# Altium footprint library 7-Connectors-11.PcbLib: 59 footprints (part 2 of 4)
Each footprint in its own frame and in the unit in brackets; x right, y up, seen from the top. Pads: shape width x height; smd on the part's side, far side on the other; paste and mask are expansions set on the pad; w line width, h text height; cw(c..) or ccw(c..) is an arc to the next point about the centre after c.
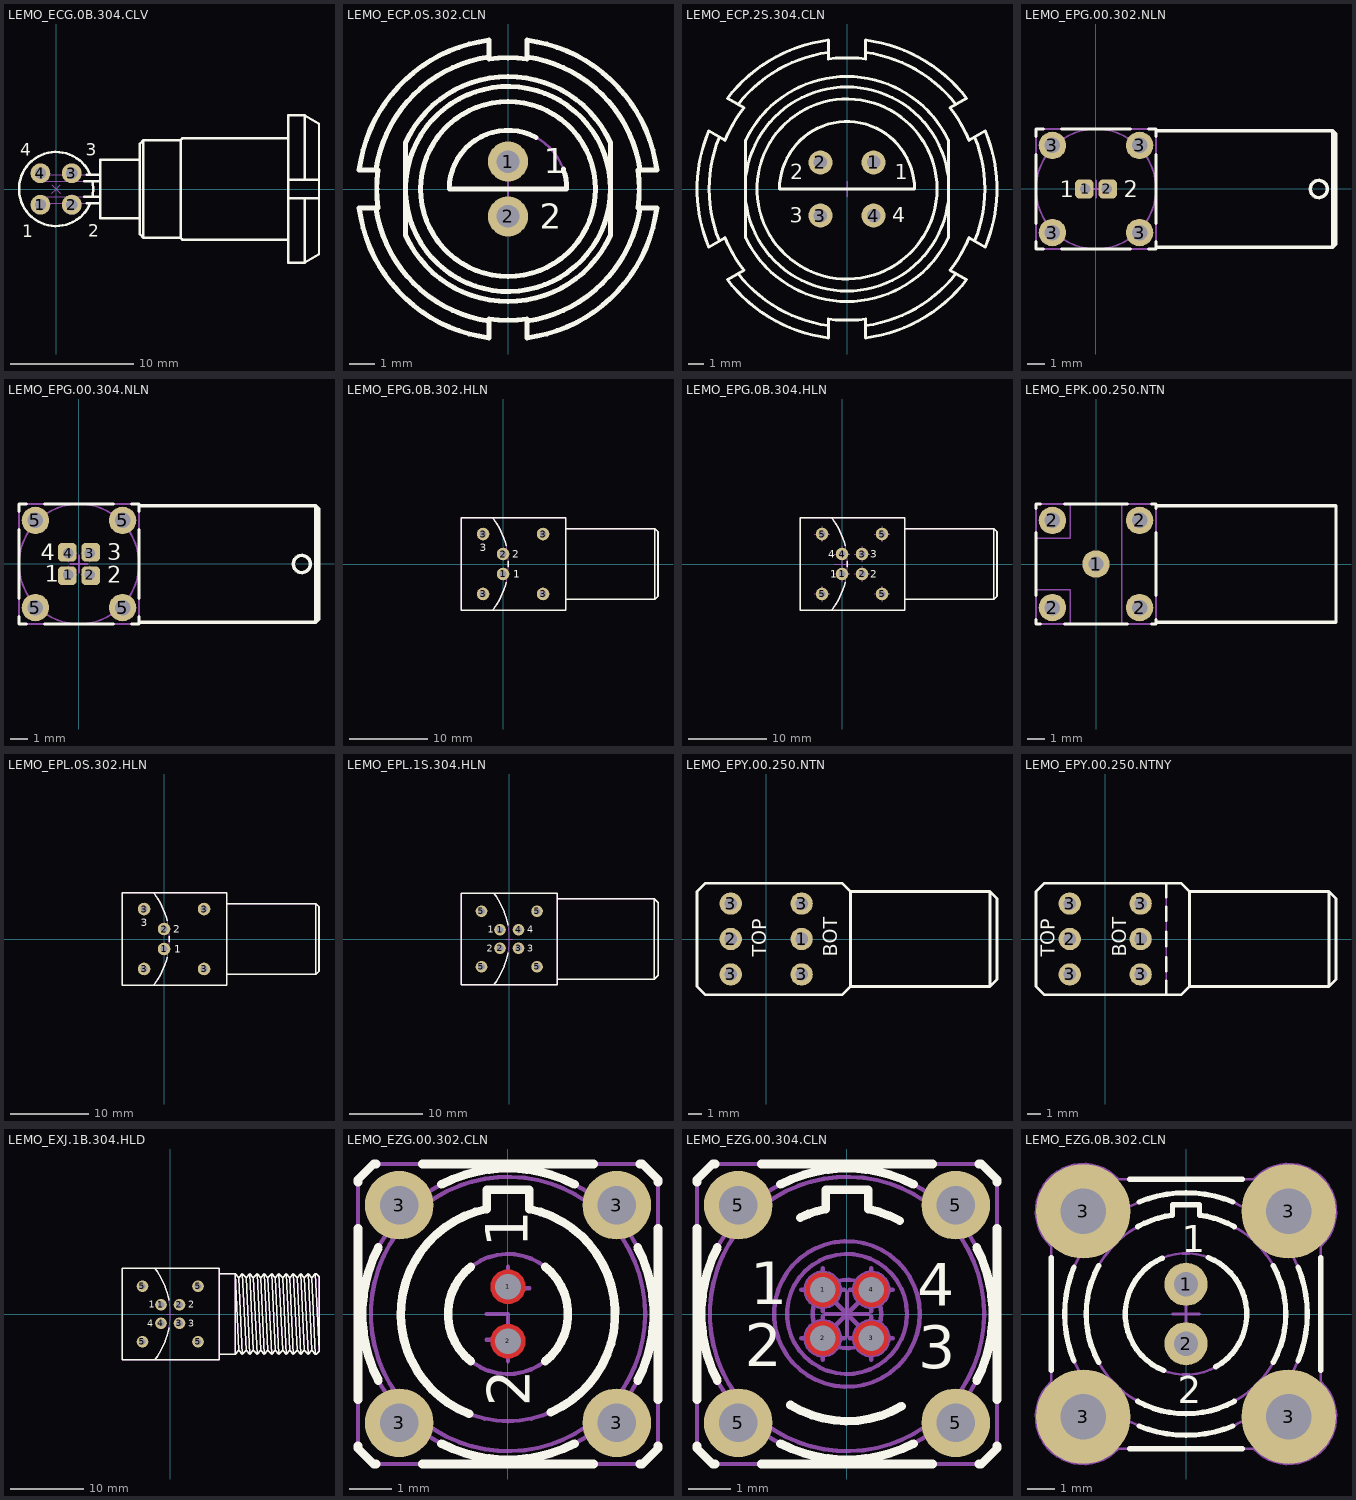
[diagram p1: the footprints below, top view; thin cyan lines are the x and y axes]

## LEMO_ECG.0B.304.CLV [mm] "Size 0B, 4 Female Contacts Elbow Receptacle (90? With Two Nut For Panel Mounting"
height 15.5
pads (4):
  round 1.6 hole 0.9: 1(-1.27,-1.27) 2(1.27,-1.27) 3(1.27,1.27) 4(-1.27,1.27)
Top Overlay:
  lines w0.2: 2.288,-0.634 3.57,-0.634 ; 2.288,0.634 3.57,0.634 ; 2.462,-1.134 3.57,-1.134 ; 2.462,1.134 3.57,1.134 ; 2.777,-1.134 cw(c0,0) 2.777,1.134 ; 2.932,-0.634 ccw(c0,0) 2.932,0.634 ; 6.77,-2.36 3.57,-2.36 3.57,2.36 6.77,2.36 ; 18.77,-4.1 10.22,-4.1 10.07,-3.95 ; 18.77,-0.75 21.27,-0.75 ; 18.77,0.75 21.27,0.75 ; 18.77,4.1 10.22,4.1 10.07,3.95 ; 20.12,-0.75 20.12,-5.953 ; 20.12,0.75 20.12,5.953 ; 21.27,-4.1 21.27,4.1 ; 7.07,-3.95 6.77,-3.65 6.77,3.65 7.07,3.95 ; 7.07,-3.95 10.07,-3.95 ; 7.07,-3.95 7.07,3.95 ; 7.07,3.95 10.07,3.95 ; 10.07,-3.95 10.07,3.95 ; 20.12,-5.953 21.27,-5.283 21.27,5.283 20.12,5.953 ; 20.12,-5.953 18.77,-5.953 18.77,5.953 20.12,5.953
  text "2" at 2.602,-3.868 h1
  text "1" at -2.75,-3.9 h1
  text "3" at 2.402,2.708 h1
  text "4" at -2.898,2.708 h1
Mechanical 8:
  lines w0.1: -1.77,-1.27 -1.27,-1.27 ; -1.77,1.27 -1.27,1.27 ; -1.27,-1.77 -1.27,-1.27 ; -1.27,-0.77 -1.27,-1.27 ; -1.27,0.77 -1.27,1.27 ; -1.27,1.77 -1.27,1.27 ; -0.77,-1.27 -1.27,-1.27 ; -0.77,1.27 -1.27,1.27 ; -0.354,-0.354 0,0 ; -0.354,0.354 0,0 ; 0.354,-0.354 0,0 ; 0.354,0.354 0,0 ; 0.77,-1.27 1.27,-1.27 ; 0.77,1.27 1.27,1.27 ; 1.27,-1.77 1.27,-1.27 ; 1.27,-0.77 1.27,-1.27 ; 1.27,0.77 1.27,1.27 ; 1.27,1.77 1.27,1.27 ; 1.77,-1.27 1.27,-1.27 ; 1.77,1.27 1.27,1.27
Mechanical 14:
  lines w0.1: -1.514,-1.055 ccw(c-1.27,-1.27) -0.969,-1.147 ; -1.514,1.055 cw(c-1.27,1.27) -0.969,1.147 ; 0.532,-1.134 ccw(c1.27,-1.27) 2.008,-1.134 ; 0.873,-0.634 cw(c1.27,-1.27) 1.667,-0.634 ; 0.975,1.134 cw(c1.27,1.27) 1.565,1.134 ; 1.02,-1.134 1.02,-1.27 ccw(c1.27,-1.27) 1.52,-1.27 1.52,-1.134 ; 1.02,1.134 1.02,1.27 cw(c1.27,1.27) 1.52,1.27 1.52,1.134 ; 2.777,-1.134 cw(c0,0) 2.777,1.134 ; 2.932,-0.634 ccw(c0,0) 2.932,0.634 ; 3.57,-1.134 -0.92,-1.134 ccw(c-0.92,-1.234) -1.02,-1.234 -1.02,-1.27 cw(c-1.27,-1.27) -1.52,-1.27 -1.52,-1.134 cw(c-1.02,-1.134) -1.02,-0.634 3.57,-0.634 ; 3.57,0.634 -1.02,0.634 cw(c-1.02,1.134) -1.52,1.134 -1.52,1.27 cw(c-1.27,1.27) -1.02,1.27 -1.02,1.234 ccw(c-0.92,1.234) -0.92,1.134 3.57,1.134 ; 6.77,-2.36 3.57,-2.36 3.57,2.36 6.77,2.36 ; 18.77,-4.1 10.22,-4.1 10.07,-3.95 ; 18.77,-0.75 21.27,-0.75 ; 18.77,0.75 21.27,0.75 ; 18.77,4.1 10.22,4.1 10.07,3.95 ; 20.12,-0.75 20.12,-5.953 ; 20.12,0.75 20.12,5.953 ; 21.27,-4.1 21.27,4.1 ; 7.07,-3.95 6.77,-3.65 6.77,3.65 7.07,3.95 ; 7.07,-3.95 10.07,-3.95 ; 7.07,-3.95 7.07,3.95 ; 7.07,3.95 10.07,3.95 ; 10.07,-3.95 10.07,3.95 ; 20.12,-5.953 21.27,-5.283 21.27,5.283 20.12,5.953 ; 20.12,-5.953 18.77,-5.953 18.77,5.953 20.12,5.953
  text "2" at 2.602,-3.868 h1
  text "1" at -2.75,-3.9 h1
  text "3" at 2.402,2.708 h1
  text "4" at -2.898,2.708 h1
3D body "LEMO_ECG.0B.304.CLV_Part9.stp": height -18.7, standoff -23.7, extent -1.52,-1.52 1.52,1.52
3D body "LEMO_ECG.0B.304.CLV_Part8.stp": height -13.7, standoff -18.7, extent -1.52,-1.52 1.52,1.52
3D body "LEMO_ECG.0B.304.CLV_Part5.stp": height 2.3, standoff 0, extent -3,-3 3,3
3D body "LEMO_ECG.0B.304.CLV_Part4.stp": height 12.45, standoff 0.05, extent 13.265,-5.5 15.265,5.5
3D body "LEMO_ECG.0B.304.CLV_Part3.stp": height 12.5, standoff 0, extent 15.27,-6.25 16.27,6.25
3D body "LEMO_ECG.0B.304.CLV_Part1.stp": height 10.75, standoff -3.7, extent -1.52,-4.1 21.27,4.1
3D body "LEMO_ECG.0B.304.CLV_Part2.stp": height 12.2, standoff 0.3, extent 18.77,-5.953 21.27,5.953
3D body "LEMO_ECG.0B.304.CLV_Part6.stp": height -3.7, standoff -8.7, extent -1.52,-1.52 1.52,1.52
3D body "LEMO_ECG.0B.304.CLV_Part7.stp": height -8.7, standoff -13.7, extent -1.52,-1.52 1.52,1.52
3D body "LEMO_ECG.0B.304.CLV_Part10.stp": height -23.7, standoff -28.7, extent -1.52,-1.52 1.52,1.52
3D body "LEMO_ECG.0B.304.CLV_Part11.stp": height -28.7, standoff -33.7, extent -1.52,-1.52 1.52,1.52
3D body "LEMO_ECG.0B.304.CLV_Part12.stp": height -33.7, standoff -38.7, extent -1.52,-1.52 1.52,1.52

## LEMO_ECP.0S.302.CLN [mm] "Size 0S, Fixed Receptacle with 2 Nuts, Straight Contacts 1 Female + 1 Male  (Hermaphroditic Keying)"
height 15
pads (2):
  round 1.6 hole 0.9: 1(0,1.1) 2(0,-1.1)
Top Overlay:
  circle w0.2: c0,0 r3.5
  circle w0.2: c0,0 r4.1
  lines w0.2: -5.283,-0.75 ccw(c0,0) -0.75,-5.283 ; -5.283,0.75 cw(c0,0) -0.75,5.283 ; 0.75,-5.283 ccw(c0,0) 5.283,-0.75 ; 0.75,5.283 cw(c0,0) 5.283,0.75 ; 1.114,2.069 ccw(c0,0) -2.35,0 2.35,0 ccw(c0,0) 2.213,0.79 ; -5.953,-0.75 ccw(c0,0) -0.75,-5.953 -0.75,-5.196 ccw(c0,0) 0.75,-5.196 0.75,-5.953 ccw(c0,0) 5.953,-0.75 5.196,-0.75 ccw(c0,0) 5.196,0.75 5.953,0.75 ccw(c0,0) 0.75,5.953 0.75,5.196 ccw(c0,0) -0.75,5.196 -0.75,5.953 ccw(c0,0) -5.953,0.75 -5.196,0.75 ccw(c0,0) -5.196,-0.75 -5.953,-0.75 ; -4.1,-1.855 ccw(c0,0) 4.1,-1.855 4.1,1.855 ccw(c0,0) -4.1,1.855 -4.1,-1.855
  text "1" at 1.429,0.635 h1
  text "2" at 1.27,-1.587 h1
Mechanical 8:
  lines w0.1: -0.5,-1.1 0,-1.1 ; -0.5,0 0,0 ; -0.5,1.1 0,1.1 ; 0,-1.6 0,-1.1 ; 0,-0.6 0,-1.1 ; 0,-0.5 0,0 ; 0,0.5 0,0 ; 0,0.6 0,1.1 ; 0,1.6 0,1.1 ; 0.5,-1.1 0,-1.1 ; 0.5,0 0,0 ; 0.5,1.1 0,1.1
Mechanical 14:
  circle w0.1: c0,-1.1 r0.35
  circle w0.4: c0,-1.1 r0.2
  circle w0.1: c0,1.1 r0.35
  circle w0.1: c0,0 r3.5
  circle w0.1: c0,0 r4.1
  lines w0.1: -5.283,-0.75 ccw(c0,0) -0.75,-5.283 ; -5.283,0.75 cw(c0,0) -0.75,5.283 ; 0.75,-5.283 ccw(c0,0) 5.283,-0.75 ; 0.75,5.283 cw(c0,0) 5.283,0.75 ; -5.953,-0.75 ccw(c0,0) -0.75,-5.953 -0.75,-5.196 ccw(c0,0) 0.75,-5.196 0.75,-5.953 ccw(c0,0) 5.953,-0.75 5.196,-0.75 ccw(c0,0) 5.196,0.75 5.953,0.75 ccw(c0,0) 0.75,5.953 0.75,5.196 ccw(c0,0) -0.75,5.196 -0.75,5.953 ccw(c0,0) -5.953,0.75 -5.196,0.75 ccw(c0,0) -5.196,-0.75 -5.953,-0.75 ; -4.1,-1.855 ccw(c0,0) 4.1,-1.855 4.1,1.855 ccw(c0,0) -4.1,1.855 -4.1,-1.855 ; -2.35,0 cw(c0,0) 2.35,0 -2.35,0
  text "1" at 1.429,0.635 h1
  text "2" at 1.27,-1.587 h1
3D body "LEMO_ECP.0S.302.CLN.stp": height 15, standoff -3.2, extent -6.25,-6.25 6.25,6.25

## LEMO_ECP.2S.304.CLN [mm] "Size 2S, Fixed Receptacle with 2 Nuts, Straight Contacts 2 Females + 2 Males  (Hermaphroditic Keying)"
height 20
pads (4):
  round 1.6 hole 0.9: 1(1.768,1.768) 2(-1.768,1.768) 3(-1.768,-1.768) 4(1.768,-1.768)
Top Overlay:
  circle w0.2: c0,0 r6
  lines w0.2: -8.511,-3.471 cw(c0,0) -8.511,3.471 ; -7.261,-5.636 ccw(c0,0) -1.25,-9.106 ; -7.261,5.636 cw(c0,0) -1.25,9.106 ; -6.75,-0.823 ccw(c0,0) 6.75,-0.823 ; -6.75,0.823 cw(c0,0) 6.75,0.823 ; 1.25,-9.106 ccw(c0,0) 7.261,-5.636 ; 1.25,9.106 cw(c0,0) 7.261,5.636 ; 8.511,-3.471 ccw(c0,0) 8.511,3.471 ; -9.217,-3.878 cw(c0,0) -9.217,3.878 -8.125,3.248 cw(c0,0) -6.875,5.413 -7.967,6.043 cw(c0,0) -1.25,9.922 -1.25,8.66 cw(c0,0) 1.25,8.66 1.25,9.922 cw(c0,0) 7.967,6.043 6.875,5.413 cw(c0,0) 8.125,3.248 9.217,3.878 cw(c0,0) 9.217,-3.878 8.125,-3.248 cw(c0,0) 6.875,-5.413 7.967,-6.043 cw(c0,0) 1.25,-9.922 1.25,-8.66 cw(c0,0) -1.25,-8.66 -1.25,-9.922 cw(c0,0) -7.967,-6.043 -6.875,-5.413 cw(c0,0) -8.125,-3.248 -9.217,-3.878 ; -6.75,-3.269 ccw(c0,0) 6.75,-3.269 6.75,3.269 ccw(c0,0) -6.75,3.269 -6.75,-3.269 ; -4.5,0 cw(c0,0) 4.5,0 -4.5,0
  text "2" at -3.788,0.635 h1
  text "3" at -3.81,-2.244 h1
  text "4" at 3.016,-2.222 h1
  text "1" at 3.197,0.635 h1
Mechanical 8:
  lines w0.1: -2.268,-1.768 -1.768,-1.768 ; -2.268,1.768 -1.768,1.768 ; -1.768,-2.268 -1.768,-1.768 ; -1.768,-1.268 -1.768,-1.768 ; -1.768,1.268 -1.768,1.768 ; -1.768,2.268 -1.768,1.768 ; -1.268,-1.768 -1.768,-1.768 ; -1.268,1.768 -1.768,1.768 ; -0.5,0 0,0 ; 0,-0.5 0,0 ; 0,0.5 0,0 ; 0.5,0 0,0 ; 1.268,-1.768 1.768,-1.768 ; 1.268,1.768 1.768,1.768 ; 1.768,-2.268 1.768,-1.768 ; 1.768,-1.268 1.768,-1.768 ; 1.768,1.268 1.768,1.768 ; 1.768,2.268 1.768,1.768 ; 2.268,-1.768 1.768,-1.768 ; 2.268,1.768 1.768,1.768
Mechanical 14:
  circle w0.7: c1.768,-1.768 r0.35
  circle w0.7: c-1.768,-1.768 r0.35
  circle w0.1: c-1.768,-1.768 r0.7
  circle w0.1: c1.768,-1.768 r0.7
  circle w0.1: c-1.768,1.768 r0.7
  circle w0.1: c1.768,1.768 r0.7
  circle w0.1: c0,0 r6
  lines w0.1: -8.511,-3.471 cw(c0,0) -8.511,3.471 ; -7.261,-5.636 ccw(c0,0) -1.25,-9.106 ; -7.261,5.636 cw(c0,0) -1.25,9.106 ; -6.75,-0.823 ccw(c0,0) 6.75,-0.823 ; -6.75,0.823 cw(c0,0) 6.75,0.823 ; 1.25,-9.106 ccw(c0,0) 7.261,-5.636 ; 1.25,9.106 cw(c0,0) 7.261,5.636 ; 8.511,-3.471 ccw(c0,0) 8.511,3.471 ; -9.217,-3.878 cw(c0,0) -9.217,3.878 -8.125,3.248 cw(c0,0) -6.875,5.413 -7.967,6.043 cw(c0,0) -1.25,9.922 -1.25,8.66 cw(c0,0) 1.25,8.66 1.25,9.922 cw(c0,0) 7.967,6.043 6.875,5.413 cw(c0,0) 8.125,3.248 9.217,3.878 cw(c0,0) 9.217,-3.878 8.125,-3.248 cw(c0,0) 6.875,-5.413 7.967,-6.043 cw(c0,0) 1.25,-9.922 1.25,-8.66 cw(c0,0) -1.25,-8.66 -1.25,-9.922 cw(c0,0) -7.967,-6.043 -6.875,-5.413 cw(c0,0) -8.125,-3.248 -9.217,-3.878 ; -6.75,-3.269 ccw(c0,0) 6.75,-3.269 6.75,3.269 ccw(c0,0) -6.75,3.269 -6.75,-3.269 ; -4.5,0 cw(c0,0) 4.5,0 -4.5,0
  text "2" at -3.788,0.635 h1
  text "3" at -3.81,-2.244 h1
  text "4" at 3.016,-2.222 h1
  text "1" at 3.197,0.635 h1
3D body "LEMO_ECP.2S.304.CLN.stp": height 20, standoff -3, extent -10,-9.921 10,9.922

## LEMO_EPG.00.302.NLN [mm] "Multipole 2 Contacts, 50 Ohm size 00 Coaxial Elbow (90? Socket With Key"
height 7
pads (6):
  rrect50% 1.1x1.1 hole 0.6 copper offset -0.05,0: 1(-0.635,0)
  rrect50% 1.1x1.1 hole 0.6 copper offset 0.05,0: 2(0.635,0)
  round 1.6 hole 0.9: 3(-2.54,-2.54) 3(-2.54,2.54) 3(2.54,-2.54) 3(2.54,2.54)
Top Overlay:
  circle w0.2: c13,0 r0.5
  lines w0.2: -3.5,-3.077 -3.5,-3.5 -3.077,-3.5 ; -3.5,-2.003 -3.5,2.003 ; -3.5,3.077 -3.5,3.5 -3.077,3.5 ; -2.003,-3.5 2.003,-3.5 ; -2.003,3.5 2.003,3.5 ; 3.077,-3.5 3.5,-3.5 3.5,-3.077 ; 3.077,3.5 3.5,3.5 3.5,3.077 ; 3.5,-3.4 13.8,-3.4 ; 3.5,-2.003 3.5,2.003 ; 3.5,3.399 13.8,3.4 ; 13.8,-3.4 14,-3.2 14,3.2 13.8,3.4 ; 13.8,-3.4 13.8,3.4
  text "2" at 1.613,-0.473 h0.97
  text "1" at -2.119,-0.48 h0.97
Mechanical 8:
  lines w0.1: -3.04,-2.54 -2.54,-2.54 ; -3.04,2.54 -2.54,2.54 ; -2.54,-3.04 -2.54,-2.54 ; -2.54,-2.04 -2.54,-2.54 ; -2.54,2.04 -2.54,2.54 ; -2.54,3.04 -2.54,2.54 ; -2.04,-2.54 -2.54,-2.54 ; -2.04,2.54 -2.54,2.54 ; -1.1,0 -0.6,0 ; -0.6,-0.5 -0.6,0 ; -0.6,0.5 -0.6,0 ; -0.5,0 0,0 ; -0.1,0 -0.6,0 ; 0,-0.5 0,0 ; 0,0.5 0,0 ; 0.1,0 0.6,0 ; 0.5,0 0,0 ; 0.6,-0.5 0.6,0 ; 0.6,0.5 0.6,0 ; 1.1,0 0.6,0 ; 2.04,-2.54 2.54,-2.54 ; 2.04,2.54 2.54,2.54 ; 2.54,-3.04 2.54,-2.54 ; 2.54,-2.04 2.54,-2.54 ; 2.54,2.04 2.54,2.54 ; 2.54,3.04 2.54,2.54 ; 3.04,-2.54 2.54,-2.54 ; 3.04,2.54 2.54,2.54
Mechanical 14:
  circle w0.1: c0,0 r3.5
  circle w0.1: c13,0 r0.5
  lines w0.1: 3.5,-3.4 13.8,-3.4 ; 3.5,3.399 13.8,3.4 ; 13.8,-3.4 14,-3.2 14,3.2 13.8,3.4 ; 13.8,-3.4 13.8,3.4 ; -3.5,-3.5 3.5,-3.5 3.5,3.5 -3.5,3.5 -3.5,-3.5
  text "2" at 1.613,-0.473 h0.97
  text "1" at -2.119,-0.48 h0.97
3D body "LEMO_EPG.00.302.NLN.stp": height 7, standoff -3, extent -3.5,-3.5 14,3.5

## LEMO_EPG.00.304.NLN [mm] "Multipole 4 Contacts, 50 Ohm size 00 Coaxial Elbow (90? Socket With Key"
height 7
pads (8):
  rrect50% 1.1x1.1 hole 0.6 copper offset -0.05,-0.05: 1(-0.635,-0.635)
  rrect50% 1.1x1.1 hole 0.6 copper offset 0.05,-0.05: 2(0.635,-0.635)
  rrect50% 1.1x1.1 hole 0.6 copper offset 0.05,0.05: 3(0.635,0.635)
  rrect50% 1.1x1.1 hole 0.6 copper offset -0.05,0.05: 4(-0.635,0.635)
  round 1.6 hole 0.9: 5(-2.54,-2.54) 5(-2.54,2.54) 5(2.54,-2.54) 5(2.54,2.54)
Top Overlay:
  circle w0.2: c13,0 r0.5
  lines w0.2: -3.5,-3.077 -3.5,-3.5 -3.077,-3.5 ; -3.5,-2.003 -3.5,2.003 ; -3.5,3.077 -3.5,3.5 -3.077,3.5 ; -2.003,-3.5 2.003,-3.5 ; -2.003,3.5 2.003,3.5 ; 3.077,-3.5 3.5,-3.5 3.5,-3.077 ; 3.077,3.5 3.5,3.5 3.5,3.077 ; 3.5,-3.4 13.8,-3.4 ; 3.5,-2.003 3.5,2.003 ; 3.5,3.399 13.8,3.4 ; 13.8,-3.4 13.8,3.4 ; 13.8,-3.4 14,-3.2 14,3.2 13.8,3.4
  text "1" at -2.007,-1.048 h0.97
  text "4" at -2.231,0.232 h0.97
  text "3" at 1.652,0.208 h0.97
  text "2" at 1.648,-1.108 h0.97
Mechanical 8:
  lines w0.1: -3.04,-2.54 -2.54,-2.54 ; -3.04,2.54 -2.54,2.54 ; -2.54,-3.04 -2.54,-2.54 ; -2.54,-2.04 -2.54,-2.54 ; -2.54,2.04 -2.54,2.54 ; -2.54,3.04 -2.54,2.54 ; -2.04,-2.54 -2.54,-2.54 ; -2.04,2.54 -2.54,2.54 ; -1.135,-0.635 -0.635,-0.635 ; -1.135,0.635 -0.635,0.635 ; -0.635,-1.135 -0.635,-0.635 ; -0.635,-0.135 -0.635,-0.635 ; -0.635,0.135 -0.635,0.635 ; -0.635,1.135 -0.635,0.635 ; -0.5,0 0,0 ; -0.135,-0.635 -0.635,-0.635 ; -0.135,0.635 -0.635,0.635 ; 0,-0.5 0,0 ; 0,0.5 0,0 ; 0.135,-0.635 0.635,-0.635 ; 0.135,0.635 0.635,0.635 ; 0.5,0 0,0 ; 0.635,-1.135 0.635,-0.635 ; 0.635,-0.135 0.635,-0.635 ; 0.635,0.135 0.635,0.635 ; 0.635,1.135 0.635,0.635 ; 1.135,-0.635 0.635,-0.635 ; 1.135,0.635 0.635,0.635 ; 2.04,-2.54 2.54,-2.54 ; 2.04,2.54 2.54,2.54 ; 2.54,-3.04 2.54,-2.54 ; 2.54,-2.04 2.54,-2.54 ; 2.54,2.04 2.54,2.54 ; 2.54,3.04 2.54,2.54 ; 3.04,-2.54 2.54,-2.54 ; 3.04,2.54 2.54,2.54
Mechanical 14:
  circle w0.1: c13,0 r0.5
  circle w0.1: c0,0 r3.5
  lines w0.1: 3.5,-3.4 13.8,-3.4 ; 3.5,3.399 13.8,3.4 ; 13.8,-3.4 13.8,3.4 ; 13.8,-3.4 14,-3.2 14,3.2 13.8,3.4 ; -3.5,-3.5 -3.5,3.5 3.5,3.5 3.5,-3.5 -3.5,-3.5
  text "1" at -2.007,-1.048 h0.97
  text "4" at -2.231,0.232 h0.97
  text "3" at 1.652,0.208 h0.97
  text "2" at 1.648,-1.108 h0.97
3D body "LEMO_EPG.00.304.NLN.stp": height 7, standoff -3, extent -3.5,-3.5 14,3.5

## LEMO_EPG.0B.302.HLN [mm] "Elbow Receptacle (90? With 2 Female Contacts and Key (G) For PCB"
height 12.7
pads (6):
  round 1.6 hole 0.9: 1(0,-1.27) 2(0,1.27) 3(-2.54,-3.81) 3(-2.54,3.81) 3(5.08,-3.81) 3(5.08,3.81)
Top Overlay:
  lines w0.2: -1.32,-5.85 ccw(c-8.876,0) 0.386,-2.353 ; -1.32,5.85 cw(c-8.876,0) 0.386,2.353 ; 0.674,-0.338 ccw(c-8.876,0) 0.674,0.338 ; 7.98,-4.5 19.28,-4.5 ; 7.98,4.5 19.28,4.5 ; 19.28,-4.5 19.68,-4.1 19.68,4.1 19.28,4.5 ; 19.28,-4.5 19.28,4.5 ; -5.32,-5.85 -5.32,5.85 7.98,5.85 7.98,-5.85 -5.32,-5.85
  text "1" at 1.275,-1.75 h0.97
  text "2" at 1.186,0.787 h0.97
  text "3" at -2.975,1.625 h0.97
Mechanical 14:
  circle w0.1: c0,1.27 r0.4
  circle w0.1: c0,-1.27 r0.4
  circle w0.1: c-2.54,-3.81 r0.4
  circle w0.1: c5.08,-3.81 r0.4
  circle w0.1: c5.08,3.81 r0.4
  circle w0.1: c-2.54,3.81 r0.4
  lines w0.1: -1.32,-5.85 ccw(c-8.876,0) -1.32,5.85 ; 7.98,-4.5 19.28,-4.5 ; 7.98,4.5 19.28,4.5 ; 19.28,-4.5 19.68,-4.1 19.68,4.1 19.28,4.5 ; 19.28,-4.5 19.28,4.5 ; -5.32,-5.85 -5.32,5.85 7.98,5.85 7.98,-5.85 -5.32,-5.85
  text "1" at 1.275,-1.75 h0.97
  text "2" at 1.186,0.787 h0.97
  text "3" at -2.975,1.625 h0.97
3D body "LEMO_EPG.0B.302.HLN.stp": height 12.7, standoff -4, extent -5.32,-5.85 19.68,5.85

## LEMO_EPG.0B.304.HLN [mm] "Elbow Receptacle (90? With 4 Female Contacts and Key (G) For PCB"
height 12.7
pads (8):
  round 1.6 hole 0.9: 1(0,-1.27) 2(2.54,-1.27) 3(2.54,1.27) 4(0,1.27) 5(-2.54,-3.81) 5(-2.54,3.81) 5(5.08,-3.81) 5(5.08,3.81)
Top Overlay:
  lines w0.2: -1.32,-5.85 ccw(c-8.876,0) 0.386,-2.353 ; -1.32,5.85 cw(c-8.876,0) 0.386,2.353 ; 0.674,-0.338 ccw(c-8.876,0) 0.674,0.338 ; 7.98,-4.5 19.28,-4.5 ; 7.98,4.5 19.28,4.5 ; 19.28,-4.5 19.68,-4.1 19.68,4.1 19.28,4.5 ; 19.28,-4.5 19.28,4.5 ; -5.32,-5.85 -5.32,5.85 7.98,5.85 7.98,-5.85 -5.32,-5.85
  text "4" at -1.773,0.79 h0.97
  text "3" at 3.599,0.787 h0.97
  text "1" at -1.519,-1.75 h0.97
  text "2" at 3.599,-1.753 h0.97
Mechanical 8:
  lines w0.1: -3.54,-3.81 -2.54,-3.81 ; -3.54,3.81 -2.54,3.81 ; -2.54,-4.81 -2.54,-3.81 ; -2.54,-2.81 -2.54,-3.81 ; -2.54,2.81 -2.54,3.81 ; -2.54,4.81 -2.54,3.81 ; -1.54,-3.81 -2.54,-3.81 ; -1.54,3.81 -2.54,3.81 ; -1,-1.27 0,-1.27 ; -1,0 0,0 ; -1,1.27 0,1.27 ; 0,-2.27 0,-1.27 ; 0,-1 0,0 ; 0,-0.27 0,-1.27 ; 0,0.27 0,1.27 ; 0,1 0,0 ; 0,2.27 0,1.27 ; 1,-1.27 0,-1.27 ; 1,0 0,0 ; 1,1.27 0,1.27 ; 1.54,-1.27 2.54,-1.27 ; 1.54,1.27 2.54,1.27 ; 2.54,-2.27 2.54,-1.27 ; 2.54,-0.27 2.54,-1.27 ; 2.54,0.27 2.54,1.27 ; 2.54,2.27 2.54,1.27 ; 3.54,-1.27 2.54,-1.27 ; 3.54,1.27 2.54,1.27 ; 4.08,-3.81 5.08,-3.81 ; 4.08,3.81 5.08,3.81 ; 5.08,-4.81 5.08,-3.81 ; 5.08,-2.81 5.08,-3.81 ; 5.08,2.81 5.08,3.81 ; 5.08,4.81 5.08,3.81 ; 6.08,-3.81 5.08,-3.81 ; 6.08,3.81 5.08,3.81
Mechanical 14:
  circle w0.1: c2.54,-1.27 r0.4
  circle w0.1: c2.54,1.27 r0.4
  circle w0.1: c0,1.27 r0.4
  circle w0.1: c0,-1.27 r0.4
  circle w0.1: c-2.54,-3.81 r0.4
  circle w0.1: c5.08,-3.81 r0.4
  circle w0.1: c5.08,3.81 r0.4
  circle w0.1: c-2.54,3.81 r0.4
  lines w0.1: -1.32,-5.85 ccw(c-8.876,0) -1.32,5.85 ; 7.98,-4.5 19.28,-4.5 ; 7.98,4.5 19.28,4.5 ; 19.28,-4.5 19.68,-4.1 19.68,4.1 19.28,4.5 ; 19.28,-4.5 19.28,4.5 ; -5.32,-5.85 -5.32,5.85 7.98,5.85 7.98,-5.85 -5.32,-5.85
  text "4" at -1.773,0.79 h0.97
  text "3" at 3.599,0.787 h0.97
  text "1" at -1.519,-1.75 h0.97
  text "2" at 3.599,-1.753 h0.97
3D body "LEMO_EPG.0B.304.HLN.stp": height 12.7, standoff -4, extent -5.32,-5.85 19.68,5.85

## LEMO_EPK.00.250.NTN [mm] "50 Ohm size 00 Coaxial Elbow (90? socket"
height 7
pads (5):
  round 1.6 hole 0.9: 1(0,0) 2(-2.54,-2.54) 2(-2.54,2.54) 2(2.54,-2.54) 2(2.54,2.54)
Top Overlay:
  lines w0.2: -3.5,-3.26 -3.5,-3.5 -3.26,-3.5 ; -3.5,-1.82 -3.5,1.82 ; -3.5,3.26 -3.5,3.5 -3.26,3.5 ; -1.82,-3.5 1.82,-3.5 ; -1.82,3.5 1.82,3.5 ; 3.26,-3.5 3.5,-3.5 3.5,-3.26 ; 3.26,3.5 3.5,3.5 3.5,3.26 ; 3.5,-3.4 14,-3.4 14,3.4 3.5,3.4 ; 3.5,-1.82 3.5,1.82
Mechanical 8:
  lines w0.1: -3.04,-2.54 -2.54,-2.54 ; -3.04,2.54 -2.54,2.54 ; -2.54,-3.04 -2.54,-2.54 ; -2.54,-2.04 -2.54,-2.54 ; -2.54,2.04 -2.54,2.54 ; -2.54,3.04 -2.54,2.54 ; -2.04,-2.54 -2.54,-2.54 ; -2.04,2.54 -2.54,2.54 ; -0.5,0 0,0 ; 0,-0.5 0,0 ; 0,0.5 0,0 ; 0.5,0 0,0 ; 2.04,-2.54 2.54,-2.54 ; 2.04,2.54 2.54,2.54 ; 2.54,-3.04 2.54,-2.54 ; 2.54,-2.04 2.54,-2.54 ; 2.54,2.04 2.54,2.54 ; 2.54,3.04 2.54,2.54 ; 3.04,-2.54 2.54,-2.54 ; 3.04,2.54 2.54,2.54 ; -3.5,-3.5 -1.5,-3.5 -1.5,-1.5 -3.5,-1.5 -3.5,-3.5 ; -3.5,1.5 -1.5,1.5 -1.5,3.5 -3.5,3.5 -3.5,1.5 ; 1.5,-3.5 1.5,3.5 3.5,3.5 3.5,-3.5 1.5,-3.5
Mechanical 14:
  lines w0.1: 1.5,-3.5 3.5,-3.5 ; 3.5,-3.4 14,-3.4 14,3.4 3.5,3.4 ; 3.5,-3.5 3.5,3.5 ; 3.5,-3.5 -3.5,-3.5 -3.5,3.5 3.5,3.5 ; 3.5,-3.5 3.5,3.5
3D body "LEMO_EPK.00.250.NTN.stp": height 7, standoff -3, extent -3.5,-3.5 14,3.5

## LEMO_EPL.0S.302.HLN [mm] "Elbow Receptacle (90? With 1 Female + 1 Male Contacts and Hermaphroditic Keying"
height 12.7
pads (6):
  round 1.6 hole 0.9: 1(0,-1.27) 2(0,1.27) 3(-2.54,-3.81) 3(-2.54,3.81) 3(5.08,-3.81) 3(5.08,3.81)
Top Overlay:
  lines w0.2: -1.32,-5.85 ccw(c-8.876,0) 0.386,-2.353 ; -1.32,5.85 cw(c-8.876,0) 0.386,2.353 ; 0.674,-0.338 ccw(c-8.876,0) 0.674,0.338 ; 7.98,-4.5 19.28,-4.5 ; 7.98,4.5 19.28,4.5 ; 19.28,-4.5 19.28,4.5 ; 19.28,-4.5 19.68,-4.1 19.68,4.1 19.28,4.5 ; -5.32,-5.85 7.98,-5.85 7.98,5.85 -5.32,5.85 -5.32,-5.85
  text "3" at -2.975,1.625 h0.97
  text "2" at 1.186,0.787 h0.97
  text "1" at 1.275,-1.75 h0.97
Mechanical 14:
  circle w0.1: c-2.54,3.81 r0.4
  circle w0.1: c5.08,3.81 r0.4
  circle w0.1: c5.08,-3.81 r0.4
  circle w0.1: c-2.54,-3.81 r0.4
  circle w0.1: c0,-1.27 r0.4
  circle w0.1: c0,1.27 r0.4
  lines w0.1: -1.32,-5.85 ccw(c-8.876,0) -1.32,5.85 ; 7.98,-4.5 19.28,-4.5 ; 7.98,4.5 19.28,4.5 ; 19.28,-4.5 19.28,4.5 ; 19.28,-4.5 19.68,-4.1 19.68,4.1 19.28,4.5 ; -5.32,-5.85 7.98,-5.85 7.98,5.85 -5.32,5.85 -5.32,-5.85
  text "3" at -2.975,1.625 h0.97
  text "2" at 1.186,0.787 h0.97
  text "1" at 1.275,-1.75 h0.97
3D body "LEMO_EPL.0S.302.HLN.stp": height 12.7, standoff -4, extent -5.32,-5.85 19.68,5.85

## LEMO_EPL.1S.304.HLN [mm] "Elbow Socket (90? With 2 Female + 2 Male Contacts For PCB, Serie 1S"
height 14
pads (8):
  round 1.6 hole 0.9: 1(-1.27,1.27) 2(-1.27,-1.27) 3(1.27,-1.27) 4(1.27,1.27) 5(-3.81,-3.81) 5(-3.81,3.81) 5(3.81,-3.81) 5(3.81,3.81)
Top Overlay:
  lines w0.2: -2.132,-6.3 ccw(c-10.375,0) -0.169,-1.861 ; -2.132,6.3 cw(c-10.375,0) -0.169,1.861 ; 6.6,-5.5 19.9,-5.5 ; 6.6,5.5 19.9,5.5 ; 19.9,-5.5 19.9,5.5 ; 19.9,-5.5 20.4,-5 20.4,5 19.9,5.5 ; -6.6,-6.3 6.6,-6.3 6.6,6.3 -6.6,6.3 -6.6,-6.3
  text "1" at -2.932,0.827 h0.97
  text "4" at 2.48,0.827 h0.97
  text "2" at -3.12,-1.748 h0.97
  text "3" at 2.477,-1.717 h0.97
Mechanical 8:
  lines w0.1: -4.31,-3.81 -3.81,-3.81 ; -4.31,3.81 -3.81,3.81 ; -3.81,-4.31 -3.81,-3.81 ; -3.81,-3.31 -3.81,-3.81 ; -3.81,3.31 -3.81,3.81 ; -3.81,4.31 -3.81,3.81 ; -3.31,-3.81 -3.81,-3.81 ; -3.31,3.81 -3.81,3.81 ; -1.77,-1.27 -1.27,-1.27 ; -1.77,1.27 -1.27,1.27 ; -1.27,-1.77 -1.27,-1.27 ; -1.27,-0.77 -1.27,-1.27 ; -1.27,0.77 -1.27,1.27 ; -1.27,1.77 -1.27,1.27 ; -0.77,-1.27 -1.27,-1.27 ; -0.77,1.27 -1.27,1.27 ; -0.5,0 0,0 ; 0,-0.5 0,0 ; 0,0.5 0,0 ; 0.5,0 0,0 ; 0.77,-1.27 1.27,-1.27 ; 0.77,1.27 1.27,1.27 ; 1.27,-1.77 1.27,-1.27 ; 1.27,-0.77 1.27,-1.27 ; 1.27,0.77 1.27,1.27 ; 1.27,1.77 1.27,1.27 ; 1.77,-1.27 1.27,-1.27 ; 1.77,1.27 1.27,1.27 ; 3.31,-3.81 3.81,-3.81 ; 3.31,3.81 3.81,3.81 ; 3.81,-4.31 3.81,-3.81 ; 3.81,-3.31 3.81,-3.81 ; 3.81,3.31 3.81,3.81 ; 3.81,4.31 3.81,3.81 ; 4.31,-3.81 3.81,-3.81 ; 4.31,3.81 3.81,3.81
Mechanical 14:
  lines w0.1: -2.132,-6.3 ccw(c-10.375,0) -2.132,6.3 ; 6.6,-5.5 19.9,-5.5 ; 6.6,5.5 19.9,5.5 ; 19.9,-5.5 19.9,5.5 ; 19.9,-5.5 20.4,-5 20.4,5 19.9,5.5 ; -6.6,-6.3 6.6,-6.3 6.6,6.3 -6.6,6.3 -6.6,-6.3
  text "1" at -2.932,0.827 h0.97
  text "4" at 2.48,0.827 h0.97
  text "2" at -3.12,-1.748 h0.97
  text "3" at 2.477,-1.717 h0.97
3D body "LEMO_EPL.1S.304.HLN.stp": height 14, standoff -4, extent -6.6,-6.3 20.4,6.3

## LEMO_EPY.00.250.NTN [mm] "Dual 50 ohms Size 00 Coaxial Elbow Sockets (90?"
height 14.8
pads (6):
  round 1.6 hole 0.9: 1(2.54,0) 2(-2.54,0) 3(-2.54,-2.54) 3(-2.54,2.54) 3(2.54,-2.54) 3(2.54,2.54)
Top Overlay:
  lines w0.2: 6.04,-3.4 16.04,-3.4 ; 6.04,-3.4 6.04,3.4 ; 6.04,-3.4 5.44,-4 -4.36,-4 -4.96,-3.4 -4.96,3.4 -4.36,4 5.44,4 6.04,3.4 ; 6.04,3.4 16.04,3.4 ; 16.04,-3.4 16.04,3.4 ; 16.04,-3.4 16.54,-2.9 16.54,2.9 16.04,3.4
  text "BOT" at 5.08,-1.27 h1
  text "TOP" at 0,-1.27 h1
Mechanical 14:
  lines w0.1: 6.04,-3.4 16.04,-3.4 ; 6.04,-3.4 6.04,3.4 ; 6.04,-3.4 5.44,-4 -4.36,-4 -4.96,-3.4 -4.96,3.4 -4.36,4 5.44,4 6.04,3.4 ; 6.04,3.4 16.04,3.4 ; 16.04,-3.4 16.04,3.4 ; 16.04,-3.4 16.54,-2.9 16.54,2.9 16.04,3.4
  text "BOT" at 5.08,-1.27 h1
  text "TOP" at 0,-1.27 h1
3D body "LEMO_EPY.00.250.NTN.stp": height 14.8, standoff -3, extent -4.96,-4 16.54,4

## LEMO_EPY.00.250.NTNY [mm] "Dual 50 ohms Low Profile Size 00 Coaxial Elbow Sockets (90?"
height 13.7
pads (6):
  round 1.6 hole 0.9: 1(2.54,0) 2(-2.54,0) 3(-2.54,-2.54) 3(-2.54,2.54) 3(2.54,-2.54) 3(2.54,2.54)
Top Overlay:
  lines w0.2: 4.37,-4 4.37,-3 ; 4.37,-2.318 4.37,-1.318 ; 4.37,-0.5 4.37,0.5 ; 4.37,1.318 4.37,2.318 ; 4.37,3 4.37,4 ; 6.04,-3.4 5.44,-4 -4.36,-4 -4.96,-3.4 -4.96,3.4 -4.36,4 5.44,4 6.04,3.4 ; 6.04,-3.4 6.04,3.4 ; 6.04,-3.4 16.04,-3.4 ; 6.04,3.4 16.04,3.4 ; 16.04,-3.4 16.54,-2.9 16.54,2.9 16.04,3.4 ; 16.04,-3.4 16.04,3.4
  text "TOP" at -3.6,-1.27 h1
  text "BOT" at 1.51,-1.27 h1
Mechanical 14:
  lines w0.1: 4.37,-4 4.37,4 ; 6.04,-3.4 5.44,-4 -4.36,-4 -4.96,-3.4 -4.96,3.4 -4.36,4 5.44,4 6.04,3.4 ; 6.04,-3.4 6.04,3.4 ; 6.04,-3.4 16.04,-3.4 ; 6.04,3.4 16.04,3.4 ; 16.04,-3.4 16.54,-2.9 16.54,2.9 16.04,3.4 ; 16.04,-3.4 16.04,3.4
  text "TOP" at -3.6,-1.27 h1
  text "BOT" at 1.51,-1.27 h1
3D body "LEMO_EPY.00.250.NTNY.stp": height 13.7, standoff -3, extent -4.96,-4 16.54,4

## LEMO_EXJ.1B.304.HLD [mm] "Elbow Socket (90? With 4 Male Contacts For PCB And Keys (J), Serie 1B"
height 14
pads (8):
  round 1.6 hole 0.9: 1(-1.27,1.27) 2(1.27,1.27) 3(1.27,-1.27) 4(-1.27,-1.27) 5(-3.81,-3.81) 5(-3.81,3.81) 5(3.81,-3.81) 5(3.81,3.81)
Top Overlay:
  lines w0.2: -2.132,-6.3 ccw(c-10.375,0) -0.169,-1.861 ; -2.132,6.3 cw(c-10.375,0) -0.169,1.861 ; 6.71,-5.5 8.91,-5.5 ; 6.71,5.5 8.91,5.5 ; 20.41,-5 19.91,5.5 ; 8.91,-5.5 9.41,-5 ; 8.91,-5.5 8.91,5.5 ; 8.91,5.5 9.41,5 ; 8.91,5.5 9.41,-5 ; 9.41,-5 9.91,-5.5 ; 9.41,5 9.91,5.5 ; 9.41,5 9.91,-5.5 ; 9.91,-5.5 10.41,-5 ; 9.91,5.5 10.41,5 ; 9.91,5.5 10.41,-5 ; 10.41,-5 10.91,-5.5 ; 10.41,5 10.91,5.5 ; 10.41,5 10.91,-5.5 ; 10.91,-5.5 11.41,-5 ; 10.91,5.5 11.41,5 ; 10.91,5.5 11.41,-5 ; 11.41,-5 11.91,-5.5 ; 11.41,5 11.91,5.5 ; 11.41,5 11.91,-5.5 ; 11.91,-5.5 12.41,-5 ; 11.91,5.5 12.41,5 ; 11.91,5.5 12.41,-5 ; 12.41,-5 12.91,-5.5 ; 12.41,5 12.91,5.5 ; 12.41,5 12.91,-5.5 ; 12.91,-5.5 13.41,-5 ; 12.91,5.5 13.41,5 ; 12.91,5.5 13.41,-5 ; 13.41,-5 13.91,-5.5 ; 13.41,5 13.91,5.5 ; 13.41,5 13.91,-5.5 ; 13.91,-5.5 14.41,-5 ; 13.91,5.5 14.41,5 ; 13.91,5.5 14.41,-5 ; 14.41,-5 14.91,-5.5 ; 14.41,5 14.91,5.5 ; 14.41,5 14.91,-5.5 ; 14.91,-5.5 15.41,-5 ; 14.91,5.5 15.41,5 ; 14.91,5.5 15.41,-5 ; 15.41,-5 15.91,-5.5 ; 15.41,5 15.91,5.5 ; 15.41,5 15.91,-5.5 ; 15.91,-5.5 16.41,-5 ; 15.91,5.5 16.41,5 ; 15.91,5.5 16.41,-5 ; 16.41,-5 16.91,-5.5 ; 16.41,5 16.91,5.5 ; 16.41,5 16.91,-5.5 ; 16.91,-5.5 17.41,-5 ; 16.91,5.5 17.41,5 ; 16.91,5.5 17.41,-5 ; 17.41,-5 17.91,-5.5 ; 17.41,5 17.91,5.5 ; 17.41,5 17.91,-5.5 ; 17.91,-5.5 18.41,-5 ; 17.91,5.5 18.41,5 ; 17.91,5.5 18.41,-5 ; 18.41,-5 18.91,-5.5 ; 18.41,5 18.91,5.5 ; 18.41,5 18.91,-5.5 ; 18.91,-5.5 19.41,-5 ; 18.91,5.5 19.41,5 ; 18.91,5.5 19.41,-5 ; 19.41,-5 19.91,-5.5 ; 19.41,5 19.91,5.5 ; 19.41,5 19.91,-5.5 ; 19.91,-5.5 20.01,-5.5 20.41,-5.1 20.41,5.1 20.01,5.5 19.91,5.5 ; -6.59,-6.3 6.71,-6.3 6.71,6.3 -6.59,6.3 -6.59,-6.3
  text "3" at 2.477,-1.717 h0.97
  text "4" at -3.12,-1.748 h0.97
  text "2" at 2.48,0.827 h0.97
  text "1" at -2.932,0.827 h0.97
Mechanical 8:
  lines w0.1: -4.31,-3.81 -3.81,-3.81 ; -4.31,3.81 -3.81,3.81 ; -3.81,-4.31 -3.81,-3.81 ; -3.81,-3.31 -3.81,-3.81 ; -3.81,3.31 -3.81,3.81 ; -3.81,4.31 -3.81,3.81 ; -3.31,-3.81 -3.81,-3.81 ; -3.31,3.81 -3.81,3.81 ; -1.77,-1.27 -1.27,-1.27 ; -1.77,1.27 -1.27,1.27 ; -1.27,-1.77 -1.27,-1.27 ; -1.27,-0.77 -1.27,-1.27 ; -1.27,0.77 -1.27,1.27 ; -1.27,1.77 -1.27,1.27 ; -0.77,-1.27 -1.27,-1.27 ; -0.77,1.27 -1.27,1.27 ; -0.5,0 0,0 ; 0,-0.5 0,0 ; 0,0.5 0,0 ; 0.5,0 0,0 ; 0.77,-1.27 1.27,-1.27 ; 0.77,1.27 1.27,1.27 ; 1.27,-1.77 1.27,-1.27 ; 1.27,-0.77 1.27,-1.27 ; 1.27,0.77 1.27,1.27 ; 1.27,1.77 1.27,1.27 ; 1.77,-1.27 1.27,-1.27 ; 1.77,1.27 1.27,1.27 ; 3.31,-3.81 3.81,-3.81 ; 3.31,3.81 3.81,3.81 ; 3.81,-4.31 3.81,-3.81 ; 3.81,-3.31 3.81,-3.81 ; 3.81,3.31 3.81,3.81 ; 3.81,4.31 3.81,3.81 ; 4.31,-3.81 3.81,-3.81 ; 4.31,3.81 3.81,3.81
Mechanical 14:
  lines w0.1: -2.132,-6.3 ccw(c-10.375,0) -2.132,6.3 ; 6.71,-5.5 8.91,-5.5 ; 6.71,5.5 8.91,5.5 ; 20.41,-5 19.91,5.5 ; 8.91,-5.5 9.41,-5 ; 8.91,-5.5 8.91,5.5 ; 8.91,5.5 9.41,5 ; 8.91,5.5 9.41,-5 ; 9.41,-5 9.91,-5.5 ; 9.41,5 9.91,5.5 ; 9.41,5 9.91,-5.5 ; 9.91,-5.5 10.41,-5 ; 9.91,5.5 10.41,5 ; 9.91,5.5 10.41,-5 ; 10.41,-5 10.91,-5.5 ; 10.41,5 10.91,5.5 ; 10.41,5 10.91,-5.5 ; 10.91,-5.5 11.41,-5 ; 10.91,5.5 11.41,5 ; 10.91,5.5 11.41,-5 ; 11.41,-5 11.91,-5.5 ; 11.41,5 11.91,5.5 ; 11.41,5 11.91,-5.5 ; 11.91,-5.5 12.41,-5 ; 11.91,5.5 12.41,5 ; 11.91,5.5 12.41,-5 ; 12.41,-5 12.91,-5.5 ; 12.41,5 12.91,5.5 ; 12.41,5 12.91,-5.5 ; 12.91,-5.5 13.41,-5 ; 12.91,5.5 13.41,5 ; 12.91,5.5 13.41,-5 ; 13.41,-5 13.91,-5.5 ; 13.41,5 13.91,5.5 ; 13.41,5 13.91,-5.5 ; 13.91,-5.5 14.41,-5 ; 13.91,5.5 14.41,5 ; 13.91,5.5 14.41,-5 ; 14.41,-5 14.91,-5.5 ; 14.41,5 14.91,5.5 ; 14.41,5 14.91,-5.5 ; 14.91,-5.5 15.41,-5 ; 14.91,5.5 15.41,5 ; 14.91,5.5 15.41,-5 ; 15.41,-5 15.91,-5.5 ; 15.41,5 15.91,5.5 ; 15.41,5 15.91,-5.5 ; 15.91,-5.5 16.41,-5 ; 15.91,5.5 16.41,5 ; 15.91,5.5 16.41,-5 ; 16.41,-5 16.91,-5.5 ; 16.41,5 16.91,5.5 ; 16.41,5 16.91,-5.5 ; 16.91,-5.5 17.41,-5 ; 16.91,5.5 17.41,5 ; 16.91,5.5 17.41,-5 ; 17.41,-5 17.91,-5.5 ; 17.41,5 17.91,5.5 ; 17.41,5 17.91,-5.5 ; 17.91,-5.5 18.41,-5 ; 17.91,5.5 18.41,5 ; 17.91,5.5 18.41,-5 ; 18.41,-5 18.91,-5.5 ; 18.41,5 18.91,5.5 ; 18.41,5 18.91,-5.5 ; 18.91,-5.5 19.41,-5 ; 18.91,5.5 19.41,5 ; 18.91,5.5 19.41,-5 ; 19.41,-5 19.91,-5.5 ; 19.41,5 19.91,5.5 ; 19.41,5 19.91,-5.5 ; 19.91,-5.5 20.01,-5.5 20.41,-5.1 20.41,5.1 20.01,5.5 19.91,5.5 ; -6.59,-6.3 6.71,-6.3 6.71,6.3 -6.59,6.3 -6.59,-6.3
  text "3" at 2.477,-1.717 h0.97
  text "4" at -3.12,-1.748 h0.97
  text "2" at 2.48,0.827 h0.97
  text "1" at -2.932,0.827 h0.97
3D body "LEMO_EXJ.1B.304.HLD.stp": height 14, standoff -3.2, extent -6.59,-6.3 20.41,6.3
3D body "LEMO_EXJ.1B.304.HLD_Washer.stp": height 15.5, standoff -0.5, extent 8.91,-8 12.41,8
3D body "LEMO_EXJ.1B.304.HLD_Nut.stp": height 14.44, standoff 0.56, extent 16.91,-6.942 20.41,6.942

## LEMO_EZG.00.302.CLN [mm] "Size 00, Straight Receptacle with 2 Female Contacts and Alignment Key (G)"
height 14
pads (6):
  round 0.2 / inner rrect50% 1.1x1.1 / far side rrect50% 1.1x1.1 hole 0.6 copper offset 0,0.05: 1(0,0.635)
  round 0.2 / inner rrect50% 1.1x1.1 / far side rrect50% 1.1x1.1 hole 0.6 copper offset 0,-0.05: 2(0,-0.635)
  round 1.6 hole 0.9: 3(-2.54,-2.54) 3(-2.54,2.54) 3(2.54,-2.54) 3(2.54,2.54)
Top Layer:
  region: 0,-1.035 -0.08,-1.035 -0.227,-0.974 -0.339,-0.862 -0.4,-0.715 -0.4,-0.635 -0.4,-0.555 -0.339,-0.408 -0.227,-0.296 -0.08,-0.235 0,-0.235 0.08,-0.235 0.227,-0.296 0.339,-0.408 0.4,-0.555 0.4,-0.635 0.4,-0.715 0.339,-0.862 0.227,-0.974 0.08,-1.035
  region: 0,0.235 -0.08,0.235 -0.227,0.296 -0.339,0.408 -0.4,0.555 -0.4,0.635 -0.4,0.715 -0.339,0.862 -0.227,0.974 -0.08,1.035 0,1.035 0.08,1.035 0.227,0.974 0.339,0.862 0.4,0.715 0.4,0.635 0.4,0.555 0.339,0.408 0.227,0.296 0.08,0.235
Top Overlay:
  lines w0.2: -3.5,-3.077 -3.5,-3.137 -3.137,-3.5 -3.077,-3.5 ; -3.5,-2.003 -3.5,2.003 ; -3.5,3.077 -3.5,3.137 -3.137,3.5 -3.077,3.5 ; -3.025,-1.553 cw(c0,0) -3.025,1.553 ; -2.003,-3.5 2.003,-3.5 ; -2.003,3.5 2.003,3.5 ; -1.553,-3.025 ccw(c0,0) 1.553,-3.025 ; -1.553,3.025 cw(c0,0) 1.553,3.025 ; -0.906,-2.33 cw(c0,0) -0.5,2.449 -0.5,2.9 0.5,2.9 0.5,2.449 cw(c0,0) 1.002,-2.29 ; -0.866,-1.1 cw(c0,0) -0.866,1.1 ; 0.866,-1.1 ccw(c0,0) 0.866,1.1 ; 3.025,-1.553 ccw(c0,0) 3.025,1.553 ; 3.077,-3.5 3.137,-3.5 3.5,-3.137 3.5,-3.077 ; 3.077,3.5 3.137,3.5 3.5,3.137 3.5,3.077 ; 3.5,-2.003 3.5,2.003
  text "2" at 0.508,-2.159 h1
  text "1" at 0.457,1.548 h1
Mechanical 8:
  lines w0.1: -3.04,-2.54 -2.54,-2.54 -2.54,-3.04 ; -3.04,2.54 -2.54,2.54 -2.54,3.04 ; -0.5,-0.6 0,-0.6 0,-1.1 ; -0.5,0 0,0 0,-0.5 ; 0,1.1 0,0.6 0.5,0.6 ; 2.54,-3.04 2.54,-2.54 3.04,-2.54 ; 2.54,3.04 2.54,2.54 3.04,2.54
Mechanical 14:
  circle w0.1: c0,0 r3.4
  circle w0.1: c0,0 r3.2
  circle w0.1: c0,0 r1.4
  lines w0.1: -3.5,-3.137 -3.137,-3.5 3.137,-3.5 3.5,-3.137 3.5,3.137 3.137,3.5 -3.137,3.5 -3.5,3.137 -3.5,-3.137 ; -0.5,2.449 ccw(c0,0) 0.5,2.449 0.5,2.9 -0.5,2.9 -0.5,2.449
  text "2" at 0.508,-2.159 h1
  text "1" at 0.457,1.548 h1
3D body "LEMO_EZG.00.302.CLN.stp": height 14, standoff -3, extent -3.5,-3.5 3.5,3.5

## LEMO_EZG.00.304.CLN [mm] "Size 00, Straight Receptacle with 4 Female Contacts and Alignment Key (G)"
height 14
pads (8):
  round 0.2 / inner rrect50% 1.1x1.1 / far side rrect50% 1.1x1.1 hole 0.6 copper offset -0.1,0.1: 1(-0.566,0.566)
  rrect50% 0.2x0.2 / inner rrect50% 1.1x1.1 / far side rrect50% 1.1x1.1 hole 0.6 copper offset -0.1,-0.1: 2(-0.566,-0.566)
  rrect50% 0.2x0.2 / inner rrect50% 1.1x1.1 / far side rrect50% 1.1x1.1 hole 0.6 copper offset 0.1,-0.1: 3(0.566,-0.566)
  rrect50% 0.2x0.2 / inner rrect50% 1.1x1.1 / far side rrect50% 1.1x1.1 hole 0.6 copper offset 0.1,0.1: 4(0.566,0.566)
  round 1.6 hole 0.9: 5(-2.54,-2.54) 5(-2.54,2.54) 5(2.54,-2.54) 5(2.54,2.54)
Top Layer:
  region: -0.566,-0.966 -0.645,-0.966 -0.792,-0.905 -0.905,-0.792 -0.966,-0.645 -0.966,-0.566 -0.966,-0.486 -0.905,-0.339 -0.792,-0.227 -0.645,-0.166 -0.566,-0.166 -0.486,-0.166 -0.339,-0.227 -0.227,-0.339 -0.166,-0.486 -0.166,-0.566 -0.166,-0.645 -0.227,-0.792 -0.339,-0.905 -0.486,-0.966
  region: 0.566,-0.966 0.486,-0.966 0.339,-0.905 0.227,-0.792 0.166,-0.645 0.166,-0.566 0.166,-0.486 0.227,-0.339 0.339,-0.227 0.486,-0.166 0.566,-0.166 0.645,-0.166 0.792,-0.227 0.905,-0.339 0.966,-0.486 0.966,-0.566 0.966,-0.645 0.905,-0.792 0.792,-0.905 0.645,-0.966
  region: 0.566,0.166 0.486,0.166 0.339,0.227 0.227,0.339 0.166,0.486 0.166,0.566 0.166,0.645 0.227,0.792 0.339,0.905 0.486,0.966 0.566,0.966 0.645,0.966 0.792,0.905 0.905,0.792 0.966,0.645 0.966,0.566 0.966,0.486 0.905,0.339 0.792,0.227 0.645,0.166
  region: -0.566,0.166 -0.645,0.166 -0.792,0.227 -0.905,0.339 -0.966,0.486 -0.966,0.566 -0.966,0.645 -0.905,0.792 -0.792,0.905 -0.645,0.966 -0.566,0.966 -0.486,0.966 -0.339,0.905 -0.227,0.792 -0.166,0.645 -0.166,0.566 -0.166,0.486 -0.227,0.339 -0.339,0.227 -0.486,0.166
Bottom Layer:
  region: -0.566,0.166 -0.645,0.166 -0.792,0.227 -0.905,0.339 -0.966,0.486 -0.966,0.566 -0.966,0.645 -0.905,0.792 -0.792,0.905 -0.645,0.966 -0.566,0.966 -0.486,0.966 -0.339,0.905 -0.227,0.792 -0.166,0.645 -0.166,0.566 -0.166,0.486 -0.227,0.339 -0.339,0.227 -0.486,0.166
Top Overlay:
  lines w0.2: -3.5,-3.077 -3.5,-3.137 -3.137,-3.5 -3.077,-3.5 ; -3.5,-2.003 -3.5,2.003 ; -3.5,3.077 -3.5,3.137 -3.137,3.5 -3.077,3.5 ; -3.025,-1.553 cw(c0,0) -3.025,1.553 ; -2.003,-3.5 2.003,-3.5 ; -2.003,3.5 2.003,3.5 ; -1.553,-3.025 ccw(c0,0) 1.553,-3.025 ; -1.553,3.025 cw(c0,0) 1.553,3.025 ; -1.319,-2.124 ccw(c0,0) 1.279,-2.148 ; -1.09,2.25 cw(c0,0) -0.5,2.449 -0.5,2.9 0.5,2.9 0.5,2.449 cw(c0,0) 1.235,2.174 ; 3.025,-1.553 ccw(c0,0) 3.025,1.553 ; 3.077,-3.5 3.137,-3.5 3.5,-3.137 3.5,-3.077 ; 3.077,3.5 3.137,3.5 3.5,3.137 3.5,3.077 ; 3.5,-2.003 3.5,2.003
  text "2" at -2.387,-1.217 h1
  text "3" at 1.658,-1.261 h1
  text "4" at 1.638,0.188 h1
  text "1" at -2.262,0.233 h1
Mechanical 8:
  circle w0.1: c0,0 r0.8
  circle w0.1: c0,0 r1.4
  lines w0.1: -3.04,-2.54 -2.54,-2.54 ; -3.04,2.54 -2.54,2.54 ; -2.54,-3.04 -2.54,-2.54 ; -2.54,-2.04 -2.54,-2.54 ; -2.54,2.04 -2.54,2.54 ; -2.54,3.04 -2.54,2.54 ; -2.04,-2.54 -2.54,-2.54 ; -2.04,2.54 -2.54,2.54 ; -1.066,-0.566 -0.566,-0.566 ; -1.066,0.566 -0.566,0.566 ; -0.566,-1.066 -0.566,-0.566 ; -0.566,-0.066 -0.566,-0.566 ; -0.566,0.066 -0.566,0.566 ; -0.566,1.066 -0.566,0.566 ; -0.5,0 0,0 ; -0.066,-0.566 -0.566,-0.566 ; -0.066,0.566 -0.566,0.566 ; 0,-0.5 0,0 ; 0,0.5 0,0 ; 0.066,-0.566 0.566,-0.566 ; 0.066,0.566 0.566,0.566 ; 0.5,0 0,0 ; 0.566,-1.066 0.566,-0.566 ; 0.566,-0.066 0.566,-0.566 ; 0.566,0.066 0.566,0.566 ; 0.566,1.066 0.566,0.566 ; 1.066,-0.566 0.566,-0.566 ; 1.066,0.566 0.566,0.566 ; 2.04,-2.54 2.54,-2.54 ; 2.04,2.54 2.54,2.54 ; 2.54,-3.04 2.54,-2.54 ; 2.54,-2.04 2.54,-2.54 ; 2.54,2.04 2.54,2.54 ; 2.54,3.04 2.54,2.54 ; 3.04,-2.54 2.54,-2.54 ; 3.04,2.54 2.54,2.54 ; -0.566,-0.566 0.566,0.566 ; -0.566,0.566 0.566,-0.566
Mechanical 14:
  circle w0.1: c-0.566,0.566 r0.2
  circle w0.1: c-0.566,0.566 r0.4
  circle w0.1: c-0.566,-0.566 r0.4
  circle w0.1: c-0.566,-0.566 r0.2
  circle w0.1: c0.566,-0.566 r0.4
  circle w0.1: c0.566,-0.566 r0.2
  circle w0.1: c0.566,0.566 r0.2
  circle w0.1: c0.566,0.566 r0.4
  circle w0.1: c0,0 r3.2
  circle w0.1: c0,0 r3.4
  circle w0.1: c0,0 r1.7
  lines w0.1: -1.319,-2.124 ccw(c0,0) 1.279,-2.148 ; -1.09,2.25 cw(c0,0) -0.5,2.449 -0.5,2.9 0.5,2.9 0.5,2.449 cw(c0,0) 1.235,2.174 ; -3.5,-3.137 -3.137,-3.5 3.137,-3.5 3.5,-3.137 3.5,3.137 3.137,3.5 -3.137,3.5 -3.5,3.137 -3.5,-3.137
  text "2" at -2.387,-1.217 h1
  text "3" at 1.658,-1.261 h1
  text "4" at 1.638,0.188 h1
  text "1" at -2.262,0.233 h1
3D body "LEMO_EZG.00.304.CLN.stp": height 14, standoff -3, extent -3.5,-3.5 3.5,3.5

## LEMO_EZG.0B.302.CLN [mm] "Size 0B, Straight Receptacle with 2 Female Contacts and Alignment Key (G)"
height 15
pads (6):
  round 1.6 hole 0.9: 1(0,1.1) 2(0,-1.1)
  round 3.5 hole 1.7: 3(-3.81,-3.81) 3(-3.81,3.81) 3(3.81,-3.81) 3(3.81,3.81)
Top Overlay:
  lines w0.2: -5,-2.08 -5,2.08 ; -4.151,-1.738 cw(c0,0) -4.151,1.738 ; -3.239,-1.789 cw(c0,0) -3.239,1.789 ; -2.08,-5 2.08,-5 ; -2.08,5 2.08,5 ; -1.789,-3.239 ccw(c0,0) 1.789,-3.239 ; -1.789,3.239 cw(c0,0) -0.5,3.666 -0.5,4.05 0.5,4.05 0.5,3.666 cw(c0,0) 1.789,3.239 ; -1.738,-4.151 ccw(c0,0) 1.738,-4.151 ; -1.738,4.151 cw(c0,0) 1.738,4.151 ; -0.883,2.069 ccw(c0,0) -0.827,-2.093 ; 0.823,2.094 cw(c0,0) 1.103,-1.961 ; 3.239,-1.789 ccw(c0,0) 3.239,1.789 ; 4.151,-1.738 ccw(c0,0) 4.151,1.738 ; 5,-2.08 5,2.08
  text "2" at -0.299,-3.308 h1
  text "1" at -0.162,2.293 h1
Mechanical 8:
  lines w0.1: -4.31,-3.81 -3.81,-3.81 ; -4.31,3.81 -3.81,3.81 ; -3.81,-4.31 -3.81,-3.81 ; -3.81,-3.31 -3.81,-3.81 ; -3.81,3.31 -3.81,3.81 ; -3.81,4.31 -3.81,3.81 ; -3.31,-3.81 -3.81,-3.81 ; -3.31,3.81 -3.81,3.81 ; -0.5,-1.1 0,-1.1 ; -0.5,0 0,0 ; -0.5,1.1 0,1.1 ; 0,-1.6 0,-1.1 ; 0,-0.6 0,-1.1 ; 0,-0.5 0,0 ; 0,0.5 0,0 ; 0,0.6 0,1.1 ; 0,1.6 0,1.1 ; 0.5,-1.1 0,-1.1 ; 0.5,0 0,0 ; 0.5,1.1 0,1.1 ; 3.31,-3.81 3.81,-3.81 ; 3.31,3.81 3.81,3.81 ; 3.81,-4.31 3.81,-3.81 ; 3.81,-3.31 3.81,-3.81 ; 3.81,3.31 3.81,3.81 ; 3.81,4.31 3.81,3.81 ; 4.31,-3.81 3.81,-3.81 ; 4.31,3.81 3.81,3.81
Mechanical 14:
  circle w0.1: c0,1.1 r0.35
  circle w0.1: c0,-1.1 r0.35
  circle w0.1: c0,1.1 r0.55
  circle w0.1: c0,-1.1 r0.55
  circle w0.1: c0,0 r2.25
  circle w0.1: c0,0 r4.5
  lines w0.1: -5,-2.527 ccw(c-3.81,-3.81) -2.527,-5 ; -5,2.527 cw(c-3.81,3.81) -2.527,5 ; 2.527,-5 ccw(c3.81,-3.81) 5,-2.527 ; 2.527,5 cw(c3.81,3.81) 5,2.527 ; -5,-4.346 -5,4.346 -4.346,5 4.346,5 5,4.346 5,-4.346 4.346,-5 -4.346,-5 -5,-4.346 ; -0.5,3.666 ccw(c0,0) 0.5,3.666 0.5,4.05 -0.5,4.05 -0.5,3.666
  text "2" at -0.299,-3.308 h1
  text "1" at -0.162,2.293 h1
3D body "LEMO_EZG.0B.302.CLN_Part1.stp": height 15, standoff -4.5, extent -5,-5 5,5
3D body "LEMO_EZG.0B.302.CLN_Part2.stp": height 3.9, standoff -3.7, extent -5.56,-5.56 5.56,5.56